# Altium footprint library PcbLib.PcbLib: 35 footprints (part 3 of 3)
Each footprint in its own frame and in the unit in brackets; x right, y up, seen from the top. Pads: shape width x height; smd on the part's side, far side on the other; paste and mask are expansions set on the pad; w line width, h text height; cw(c..) or ccw(c..) is an arc to the next point about the centre after c.
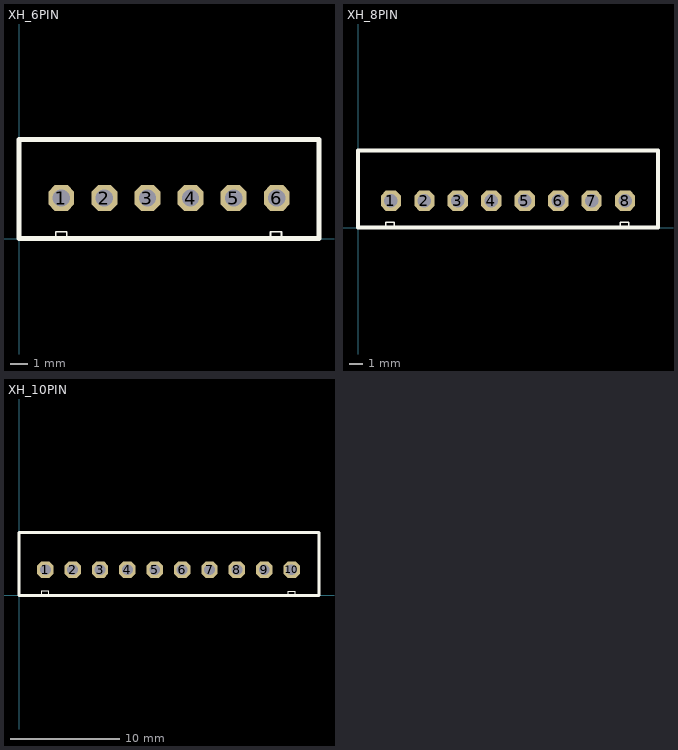
[diagram p2: the footprints below, top view; thin cyan lines are the x and y axes]

## XH_6PIN [mm]
pads (6):
  oct 1.5x1.5 hole 1: 1(2.45,2.35) 2(4.95,2.35) 3(7.45,2.35) 4(9.95,2.35) 5(12.45,2.35) 6(14.95,2.35)
Top Overlay:
  lines w0.1: 2.125,0 2.125,0.4 2.765,0.4 2.765,0 ; 14.585,0 14.585,0.4 15.225,0.4 15.225,0
  lines w0.3: 17.3,0 0,0 0,5.75 17.3,5.75 ; 17.4,0 17.4,5.75

## XH_8PIN [mm]
pads (8):
  oct 1.5x1.5 hole 1: 1(2.45,2) 2(4.95,2) 3(7.45,2) 4(9.95,2) 5(12.45,2) 6(14.95,2) 7(17.45,2) 8(19.95,2)
Top Overlay:
  lines w0.1: 2.075,0 2.075,0.4 2.715,0.4 2.715,0 ; 19.575,0 19.575,0.4 20.215,0.4 20.215,0
  lines w0.3: 22.3,0 0,0 0,5.75 22.3,5.75 ; 22.4,0 22.4,5.75

## XH_10PIN [mm]
pads (10):
  oct 1.5x1.5 hole 1: 1(2.4,2.35) 2(4.9,2.35) 3(7.4,2.35) 4(9.9,2.35) 5(12.4,2.35) 6(14.9,2.35) 7(17.4,2.35) 8(19.9,2.35) 9(22.4,2.35) 10(24.9,2.35)
Top Overlay:
  lines w0.1: 2.075,0.025 2.075,0.425 2.715,0.425 2.715,0.025 ; 24.575,0 24.575,0.4 25.215,0.4 25.215,0
  lines w0.3: 27.3,0 0,0 0,5.75 27.3,5.75 ; 27.4,0 27.4,5.75